# Altium footprint library My_Intlib.PcbLib: 224 footprints (part 8 of 14)
Each footprint in its own frame and in the unit in brackets; x right, y up, seen from the top. Pads: shape width x height; smd on the part's side, far side on the other; paste and mask are expansions set on the pad; w line width, h text height; cw(c..) or ccw(c..) is an arc to the next point about the centre after c.
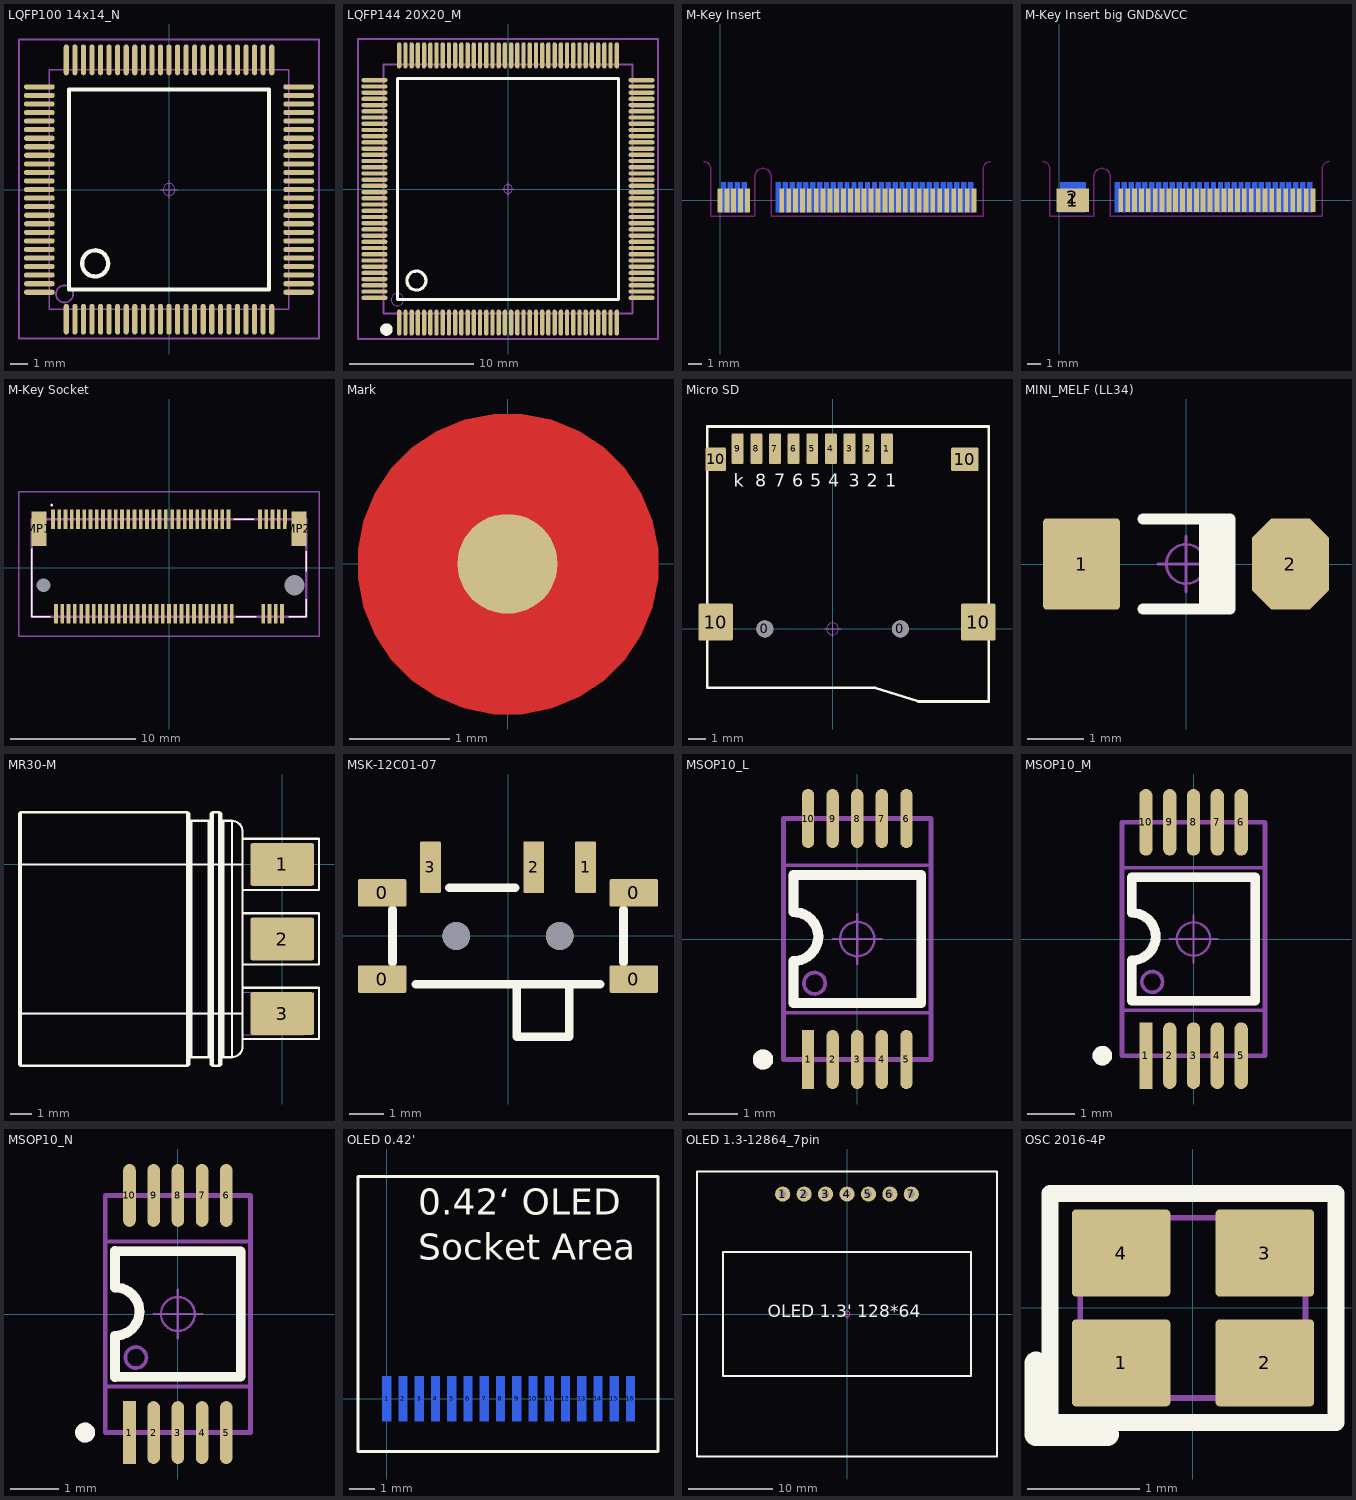
[diagram p7: the footprints below, top view; thin cyan lines are the x and y axes]

## LQFP100 14x14_N [mm] "100脚，体宽14x14mm，脚距0.5mm"
height 1.6
pads (100):
  oval 0.3x1.8 smd: 1(-6,-7.575) 2(-5.5,-7.575) 3(-5,-7.575) 4(-4.5,-7.575) 5(-4,-7.575) 6(-3.5,-7.575) 7(-3,-7.575) 8(-2.5,-7.575) 9(-2,-7.575) 10(-1.5,-7.575) 11(-1,-7.575) 12(-0.5,-7.575) 13(0,-7.575) 14(0.5,-7.575) 15(1,-7.575) 16(1.5,-7.575) 17(2,-7.575) 18(2.5,-7.575) 19(3,-7.575) 20(3.5,-7.575) 21(4,-7.575) 22(4.5,-7.575) 23(5,-7.575) 24(5.5,-7.575) 25(6,-7.575) 51(6,7.575) 52(5.5,7.575) 53(5,7.575) 54(4.5,7.575) 55(4,7.575) 56(3.5,7.575) 57(3,7.575) 58(2.5,7.575) 59(2,7.575) 60(1.5,7.575) 61(1,7.575) 62(0.5,7.575) 63(0,7.575) 64(-0.5,7.575) 65(-1,7.575) 66(-1.5,7.575) 67(-2,7.575) 68(-2.5,7.575) 69(-3,7.575) 70(-3.5,7.575) 71(-4,7.575) 72(-4.5,7.575) 73(-5,7.575) 74(-5.5,7.575) 75(-6,7.575)
  oval 1.8x0.3 smd: 26(7.576,-6) 27(7.576,-5.5) 28(7.576,-5) 29(7.576,-4.5) 30(7.576,-4) 31(7.576,-3.5) 32(7.576,-3) 33(7.576,-2.5) 34(7.576,-2) 35(7.576,-1.5) 36(7.576,-1) 37(7.576,-0.5) 38(7.576,0) 39(7.576,0.5) 40(7.576,1) 41(7.576,1.5) 42(7.576,2) 43(7.576,2.5) 44(7.576,3) 45(7.576,3.5) 46(7.576,4) 47(7.576,4.5) 48(7.576,5) 49(7.576,5.5) 50(7.576,6) 76(-7.575,6) 77(-7.575,5.5) 78(-7.575,5) 79(-7.575,4.5) 80(-7.575,4) 81(-7.575,3.5) 82(-7.575,3) 83(-7.575,2.5) 84(-7.575,2) 85(-7.575,1.5) 86(-7.575,1) 87(-7.575,0.5) 88(-7.575,0) 89(-7.575,-0.5) 90(-7.575,-1) 91(-7.575,-1.5) 92(-7.575,-2) 93(-7.575,-2.5) 94(-7.575,-3) 95(-7.575,-3.5) 96(-7.575,-4) 97(-7.575,-4.5) 98(-7.575,-5) 99(-7.575,-5.5) 100(-7.575,-6)
Top Overlay:
  circle w0.254: c-4.318,-4.318 r0.762
  lines w0.254: -5.842,-5.842 5.842,-5.842 5.842,5.842 -5.842,5.842 -5.842,-5.842
Top Value:
  text ".Comment" at 9.5,1.37 h0.89
Top Assembly:
  text ".Designator" at 9.5,2.164 h0.89
Mechanical 13:
  circle w0.1: c-6.1,-6.1 r0.5
  lines w0.1: -7,-7 -7,7 7,7 7,-7 -7,-7
Mechanical 15:
  circle w0.05: c0,0 r0.35
  lines w0.05: -0.5,0 0.5,0 ; 0,-0.5 0,0.5
  lines w0.1: -8.763,-8.7 -8.763,8.763 8.763,8.763 8.763,-8.7 -8.763,-8.7
3D body "LQFP100-14x14.STEP": height 1.45, standoff -0.01, extent -8.003,-8.003 8.003,8.003

## LQFP144 20X20_M [mm] "144脚，体宽20x20mm，脚距0.5mm"
pads (144):
  oval 0.35x2.1 smd: 1(-8.75,-10.747) 2(-8.25,-10.747) 3(-7.75,-10.747) 4(-7.25,-10.747) 5(-6.75,-10.747) 6(-6.25,-10.747) 7(-5.75,-10.747) 8(-5.25,-10.747) 9(-4.75,-10.747) 10(-4.25,-10.747) 11(-3.75,-10.747) 12(-3.25,-10.747) 13(-2.75,-10.747) 14(-2.25,-10.747) 15(-1.75,-10.747) 16(-1.25,-10.747) 17(-0.75,-10.747) 18(-0.25,-10.747) 19(0.25,-10.747) 20(0.75,-10.747) 21(1.25,-10.747) 22(1.75,-10.747) 23(2.25,-10.747) 24(2.75,-10.747) 25(3.25,-10.747) 26(3.75,-10.747) 27(4.25,-10.747) 28(4.75,-10.747) 29(5.25,-10.747) 30(5.75,-10.747) 31(6.25,-10.747) 32(6.75,-10.747) 33(7.25,-10.747) 34(7.75,-10.747) 35(8.25,-10.747) 36(8.75,-10.747) 73(8.75,10.747) 74(8.25,10.747) 75(7.75,10.747) 76(7.25,10.747) 77(6.75,10.747) 78(6.25,10.747) 79(5.75,10.747) 80(5.25,10.747) 81(4.75,10.747) 82(4.25,10.747) 83(3.75,10.747) 84(3.25,10.747) 85(2.75,10.747) 86(2.25,10.747) 87(1.75,10.747) 88(1.25,10.747) 89(0.75,10.747) 90(0.25,10.747) 91(-0.25,10.747) 92(-0.75,10.747) 93(-1.25,10.747) 94(-1.75,10.747) 95(-2.25,10.747) 96(-2.75,10.747) 97(-3.25,10.747) 98(-3.75,10.747) 99(-4.25,10.747) 100(-4.75,10.747) 101(-5.25,10.747) 102(-5.75,10.747) 103(-6.25,10.747) 104(-6.75,10.747) 105(-7.25,10.747) 106(-7.75,10.747) 107(-8.25,10.747) 108(-8.75,10.747)
  oval 2.1x0.35 smd: 37(10.747,-8.75) 38(10.747,-8.25) 39(10.747,-7.75) 40(10.747,-7.25) 41(10.747,-6.75) 42(10.747,-6.25) 43(10.747,-5.75) 44(10.747,-5.25) 45(10.747,-4.75) 46(10.747,-4.25) 47(10.747,-3.75) 48(10.747,-3.25) 49(10.747,-2.75) 50(10.747,-2.25) 51(10.747,-1.75) 52(10.747,-1.25) 53(10.747,-0.75) 54(10.747,-0.25) 55(10.747,0.25) 56(10.747,0.75) 57(10.747,1.25) 58(10.747,1.75) 59(10.747,2.25) 60(10.747,2.75) 61(10.747,3.25) 62(10.747,3.75) 63(10.747,4.25) 64(10.747,4.75) 65(10.747,5.25) 66(10.747,5.75) 67(10.747,6.25) 68(10.747,6.75) 69(10.747,7.25) 70(10.747,7.75) 71(10.747,8.25) 72(10.747,8.75) 109(-10.747,8.75) 110(-10.747,8.25) 111(-10.747,7.75) 112(-10.747,7.25) 113(-10.747,6.75) 114(-10.747,6.25) 115(-10.747,5.75) 116(-10.747,5.25) 117(-10.747,4.75) 118(-10.747,4.25) 119(-10.747,3.75) 120(-10.747,3.25) 121(-10.747,2.75) 122(-10.747,2.25) 123(-10.747,1.75) 124(-10.747,1.25) 125(-10.747,0.75) 126(-10.747,0.25) 127(-10.747,-0.25) 128(-10.747,-0.75) 129(-10.747,-1.25) 130(-10.747,-1.75) 131(-10.747,-2.25) 132(-10.747,-2.75) 133(-10.747,-3.25) 134(-10.747,-3.75) 135(-10.747,-4.25) 136(-10.747,-4.75) 137(-10.747,-5.25) 138(-10.747,-5.75) 139(-10.747,-6.25) 140(-10.747,-6.75) 141(-10.747,-7.25) 142(-10.747,-7.75) 143(-10.747,-8.25) 144(-10.747,-8.75)
Top Overlay:
  circle w0.508: c-9.779,-11.303 r0.25
  circle w0.254: c-7.366,-7.366 r0.762
  lines w0.254: -8.89,-8.892 8.89,-8.892 8.89,8.89 -8.89,8.89 -8.89,-8.892
Top Value:
  text ".Comment" at 13.945,4.064 h0.89
Top Assembly:
  text ".Designator" at 13.919,4.902 h0.89
Mechanical 13:
  circle w0.1: c-8.894,-8.894 r0.5
  lines w0.15: -10,-10 -10,10 10,10 10,-10 -10,-10
Mechanical 15:
  circle w0.05: c0,0 r0.35
  lines w0.05: -0.5,0 0.5,0 ; 0,-0.5 0,0.5
  lines w0.15: -12.065,-12.065 12.065,-12.065 12.065,12.065 -12.065,12.065 -12.065,-12.065
3D body "LQFP144-20x20.STEP": height 1.45, standoff -0.01, extent -11.003,-11.003 11.003,11.003

## M-Key Insert [mil] "M.2 金手指"
pads (67):
  rect 13.8x68 smd: 1(0,0) 3(20,0) 5(39,0) 7(59,0) 9(79,0) 11(177,0) 13(197,0) 15(216,0) 17(236,0) 19(256,0) 21(276,0) 23(295,0) 25(315,0) 27(334,0) 29(354,0) 31(374,0) 33(394,0) 35(413,0) 37(433,0) 39(453,0) 41(473,0) 43(492,0) 45(512,0) 47(531,0) 49(551,0) 51(571,0) 53(591,0) 55(610,0) 57(630,0) 59(650,0) 61(670,0) 63(689,0) 65(709,0) 67(728,0)
  rect 13.8x86 smd far side: 2(10,9) 4(29,9) 6(49,9) 8(69,9) 10(167,9) 12(187,9) 14(207,9) 16(227,9) 18(246,9) 20(266,9) 22(286,9) 24(305,9) 26(325,9) 28(345,9) 30(364,9) 32(384,9) 34(403,9) 36(423,9) 38(443,9) 40(463,9) 42(482,9) 44(502,9) 46(522,9) 48(541,9) 50(561,9) 52(580,9) 54(600,9) 56(620,9) 58(640,9) 60(659,9) 62(679,9) 64(699,9) 66(719,9)
Keep-Out Layer:
  lines w3.94: -46.39,111.45 cw(c-46.39,91.77) -26.71,91.76 -26.71,-46.03 99.31,-46.03 99.31,66.9 cw(c122.9,68.14) 146.49,66.96 146.49,-46.03 754.79,-46.03 754.79,91.76 cw(c774.47,91.77) 774.47,111.45
Top Value:
  text ".Comment" at 227,83.95 h35
Top Assembly:
  text ".Designator" at 227,115.19 h35

## M-Key Insert big GND&VCC [mil] "M.2 金手指"
pads (60):
  rect 92.99x68 smd: 1(39.42,-0.11)
  rect 72.99x86 smd far side: 2(39.39,9.01)
  rect 13.8x86 smd far side: 10(167,9) 12(187,9) 14(207,9) 16(227,9) 18(246,9) 20(266,9) 22(286,9) 24(305,9) 26(325,9) 28(345,9) 30(364,9) 32(384,9) 34(403,9) 36(423,9) 38(443,9) 40(463,9) 42(482,9) 44(502,9) 46(522,9) 48(541,9) 50(561,9) 52(580,9) 54(600,9) 56(620,9) 58(640,9) 60(659,9) 62(679,9) 64(699,9) 66(719,9)
  rect 13.8x68 smd: 11(177,0) 13(197,0) 15(216,0) 17(236,0) 19(256,0) 21(276,0) 23(295,0) 25(315,0) 27(334,0) 29(354,0) 31(374,0) 33(394,0) 35(413,0) 37(433,0) 39(453,0) 41(473,0) 43(492,0) 45(512,0) 47(531,0) 49(551,0) 51(571,0) 53(591,0) 55(610,0) 57(630,0) 59(650,0) 61(670,0) 63(689,0) 65(709,0) 67(728,0)
Keep-Out Layer:
  lines w3.94: -46.39,111.45 cw(c-46.39,91.77) -26.71,91.76 -26.71,-46.03 99.31,-46.03 99.31,66.9 cw(c122.9,68.14) 146.49,66.96 146.49,-46.03 754.79,-46.03 754.79,91.76 cw(c774.47,91.77) 774.47,111.45
Top Value:
  text ".Comment" at 221,79.95 h35
Top Assembly:
  text ".Designator" at 221,111.19 h35

## M-Key Socket [mm] "M.2 M-Key 3.2h插槽"
pads (71):
  rect 0.3x1.55 smd: 1(9.25,3.888) 2(9,-3.662) 3(8.75,3.888) 4(8.5,-3.662) 5(8.25,3.888) 6(8,-3.662) 7(7.75,3.888) 8(7.5,-3.662) 9(7.25,3.888) 10(5,-3.662) 11(4.75,3.888) 12(4.5,-3.662) 13(4.25,3.888) 14(4,-3.662) 15(3.75,3.888) 16(3.5,-3.662) 17(3.25,3.888) 18(3,-3.662) 19(2.75,3.888) 20(2.5,-3.662) 21(2.25,3.888) 22(2,-3.662) 23(1.75,3.888) 24(1.5,-3.662) 25(1.25,3.888) 26(1,-3.662) 27(0.75,3.888) 28(0.5,-3.662) 29(0.25,3.888) 30(0,-3.662) 31(-0.25,3.888) 32(-0.5,-3.662) 33(-0.75,3.888) 34(-1,-3.662) 35(-1.25,3.888) 36(-1.5,-3.662) 37(-1.75,3.888) 38(-2,-3.662) 39(-2.25,3.888) 40(-2.5,-3.662) 41(-2.75,3.888) 42(-3,-3.662) 43(-3.25,3.888) 44(-3.5,-3.662) 45(-3.75,3.888) 46(-4,-3.662) 47(-4.25,3.888) 48(-4.5,-3.662) 49(-4.75,3.888) 50(-5,-3.662) 51(-5.25,3.888) 52(-5.5,-3.662) 53(-5.75,3.888) 54(-6,-3.662) 55(-6.25,3.888) 56(-6.5,-3.662) 57(-6.75,3.888) 58(-7,-3.662) 59(-7.25,3.888) 60(-7.5,-3.662) 61(-7.75,3.888) 62(-8,-3.662) 63(-8.25,3.888) 64(-8.5,-3.662) 65(-8.75,3.888) 66(-9,-3.662) 67(-9.25,3.888)
  round 0.55 hole 1.1 unplated: MH1(-10,-1.387)
  round 0.8 hole 1.6 unplated: MH2(10,-1.387)
  rect 1.2x2.75 smd: MP1(-10.35,3.112) MP2(10.35,3.112)
Top Overlay:
  lines w0.1: -10.95,1.513 -10.95,-3.888 -9.45,-3.888 ; 5.15,3.862 6.75,3.862 ; 5.35,-3.888 6.95,-3.888 ; 9.55,-3.888 10.95,-3.888 10.95,-2.487 ; 10.95,-0.287 10.95,1.313 ; -9.4,5 ccw(c-9.35,5) -9.3,5 ccw(c-9.35,5) -9.4,5
Top Value:
  text ".Comment" at -6.35,-0.179 h0.89
Top Assembly:
  text ".Designator" at -6.35,0.614 h0.89
Mechanical 13:
  lines w0.2: -10.95,-3.888 10.95,-3.888 10.95,3.862 -10.95,3.862 -10.95,-3.888
Mechanical 15:
  lines w0.1: -11.95,-5.438 11.95,-5.438 11.95,6.05 -11.95,6.05 -11.95,-5.438
3D body "1-2199119-3.stp": height 3.11, standoff -0.52, extent -10.95,-4.21 10.95,4.49

## Mark [mm] "光学定位孔，弥补PCB生产的误差"
pads (1):
  round 1 smd mask+1: ""(0,0)
Top Layer:
  pour cut-out: -1.495,-0.001 -1.495,-0.149 -1.438,-0.439 -1.325,-0.712 -1.16,-0.958 -0.952,-1.167 -0.706,-1.331 -0.433,-1.444 -0.143,-1.501 0.005,-1.501 0.152,-1.501 0.442,-1.444 0.715,-1.331 0.961,-1.167 1.17,-0.958 1.334,-0.712 1.447,-0.439 1.505,-0.149 1.505,-0.001 1.505,0.146 1.447,0.436 1.334,0.709 1.17,0.955 0.961,1.164 0.715,1.328 0.442,1.441 0.152,1.499 0.005,1.499 -0.143,1.499 -0.433,1.441 -0.706,1.328 -0.952,1.164 -1.16,0.955 -1.325,0.709 -1.438,0.436 -1.495,0.146

## Micro SD [mm]
pads (15):
  round 1 hole 1 unplated: 0(-4,0) 0(4,0)
  rrect20% 0.7x1.8 smd: 1(3.2,10.627) 2(2.1,10.627) 3(1,10.627) 4(-0.1,10.627) 5(-1.2,10.627) 6(-2.3,10.627) 7(-3.4,10.627) 8(-4.5,10.627) 9(-5.6,10.627)
  rrect10% 2.032x2.2 smd: 10(-6.9,0.4) 10(8.6,0.4)
  rrect10% 1.2x1.4 smd: 10(-6.9,10)
  rrect10% 1.6x1.4 smd: 10(7.8,10)
Top Overlay:
  lines w0.152: 2.489,-3.47 5.054,-4.283 9.204,-4.283 9.204,11.938 -7.402,11.938 -7.402,-3.47 2.514,-3.47
  text "k" at -5.842,8.382 h0.76
  text "8" at -4.572,8.382 h0.76
  text "7" at -3.455,8.382 h0.76
  text "6" at -2.388,8.382 h0.76
  text "5" at -1.321,8.382 h0.76
  text "4" at -0.254,8.382 h0.76
  text "3" at 0.939,8.382 h0.76
  text "2" at 2.006,8.382 h0.76
  text "1" at 3.098,8.382 h0.76
Top Value:
  text ".Comment" at -2.464,5.053 h0.89
Top Assembly:
  text ".Designator" at -2.464,5.847 h0.89
Mechanical 15:
  circle w0.05: c0,0 r0.35
  lines w0.05: -0.5,0 0.5,0 ; 0,-0.5 0,0.5
3D body "TF 卡座-A.STEP": height 2, standoff -0.45, extent -7.05,-4 8.95,11.25

## MINI_MELF (LL34) [mm] "1.5*3.4mm(直径，脚距）"
pads (2):
  rrect10% 1.37x1.62 smd: 1(-1.855,0)
  oct 1.37x1.62 smd: 2(1.855,0)
Top Overlay:
  rectangle: 0.227,-0.8 0.777,0.8
  lines w0.2: -0.762,-0.8 0.777,-0.8 0.777,0.8 -0.762,0.8
Top Value:
  text ".Comment" at -2.108,-2.846 h0.89
Top Assembly:
  text ".Designator" at -2.108,-2.053 h0.89
Mechanical 15:
  circle w0.05: c0,0 r0.35
  lines w0.05: -0.5,0 0.5,0 ; 0,-0.5 0,0.5
3D body "MINI-MELF.STEP": height 1.5, standoff 0, extent -1.701,-0.75 1.701,0.75

## MR30-M [mm] "MR30公头，航模插头连接器大电流"
pads (3):
  rrect10% 3x2 smd: 1(0,0) 2(0,-3.5) 3(0,-7)
Top Overlay:
  lines w0.1: -12.36,-7 -1.86,-7 ; -12.36,0 -1.86,0 ; -4.36,-9.15 cw(c-4.26,-9.15) -4.26,-9.05 ; -4.36,2.15 ccw(c-4.26,2.15) -4.26,2.05 ; -3.36,-9.15 ccw(c-3.46,-9.15) -3.46,-9.05 ; -3.36,2.15 cw(c-3.46,2.15) -3.46,2.05 ; -2.86,-9.15 cw(c-2.76,-9.15) -2.76,-9.05 ; -2.86,2.15 ccw(c-2.76,2.15) -2.76,2.05 ; -12.26,-9.45 cw(c-12.26,-9.35) -12.36,-9.35 -12.36,2.35 cw(c-12.26,2.35) -12.26,2.45 ; -12.26,-9.45 -12.26,2.45 ; -12.26,-9.45 -4.46,-9.45 ; -12.26,2.45 -4.46,2.45 ; -4.46,-9.45 ccw(c-4.46,-9.35) -4.36,-9.35 -4.36,2.35 ccw(c-4.46,2.35) -4.46,2.45 ; -4.46,-9.45 -4.46,2.45 ; -4.26,-9.05 -3.46,-9.05 ; -4.26,-9.05 -4.26,2.05 ; -4.26,2.05 -3.46,2.05 ; -3.46,-9.05 -3.46,2.05 ; -3.26,-9.45 cw(c-3.26,-9.35) -3.36,-9.35 -3.36,2.35 cw(c-3.26,2.35) -3.26,2.45 ; -3.26,-9.45 -3.26,2.45 ; -3.26,-9.45 -2.96,-9.45 ; -3.26,2.45 -2.96,2.45 ; -2.96,-9.45 ccw(c-2.96,-9.35) -2.86,-9.35 -2.86,2.35 ccw(c-2.96,2.35) -2.96,2.45 ; -2.96,-9.45 -2.96,2.45 ; -2.76,-9.05 -2.36,-9.05 ; -2.76,-9.05 -2.76,2.05 ; -2.76,2.05 -2.36,2.05 ; -2.36,-9.05 ccw(c-2.36,-8.55) -1.86,-8.55 -1.86,1.55 ccw(c-2.36,1.55) -2.36,2.05 ; -2.36,-9.05 -2.36,2.05 ; -1.86,-8.203 1.726,-8.203 1.726,-5.79 -1.86,-5.79 -1.86,-8.203 ; -1.86,-4.703 1.726,-4.703 1.726,-2.29 -1.86,-2.29 -1.86,-4.703 ; -1.86,-1.203 1.726,-1.203 1.726,1.21 -1.86,1.21 -1.86,-1.203
Top Value:
  text ".Comment" at -11.151,-11.457 h0.89
Top Assembly:
  text ".Designator" at -11.151,-10.663 h0.89
Mechanical 15:
  lines w0.013: -12.36,-7 -1.86,-7 ; -12.36,0 -1.86,0 ; -4.36,-9.15 cw(c-4.26,-9.15) -4.26,-9.05 ; -4.36,2.15 ccw(c-4.26,2.15) -4.26,2.05 ; -3.36,-9.15 ccw(c-3.46,-9.15) -3.46,-9.05 ; -3.36,2.15 cw(c-3.46,2.15) -3.46,2.05 ; -2.86,-9.15 cw(c-2.76,-9.15) -2.76,-9.05 ; -2.86,2.15 ccw(c-2.76,2.15) -2.76,2.05 ; -1.86,-8 1.04,-8 1.04,-6 -1.86,-6 ; -12.26,-9.45 cw(c-12.26,-9.35) -12.36,-9.35 -12.36,2.35 cw(c-12.26,2.35) -12.26,2.45 ; -12.26,-9.45 -12.26,2.45 ; -12.26,-9.45 -4.46,-9.45 ; -12.26,2.45 -4.46,2.45 ; -4.46,-9.45 ccw(c-4.46,-9.35) -4.36,-9.35 -4.36,2.35 ccw(c-4.46,2.35) -4.46,2.45 ; -4.46,-9.45 -4.46,2.45 ; -4.26,-9.05 -3.46,-9.05 ; -4.26,-9.05 -4.26,2.05 ; -4.26,2.05 -3.46,2.05 ; -3.46,-9.05 -3.46,2.05 ; -3.26,-9.45 cw(c-3.26,-9.35) -3.36,-9.35 -3.36,2.35 cw(c-3.26,2.35) -3.26,2.45 ; -3.26,-9.45 -3.26,2.45 ; -3.26,-9.45 -2.96,-9.45 ; -3.26,2.45 -2.96,2.45 ; -2.96,-9.45 ccw(c-2.96,-9.35) -2.86,-9.35 -2.86,2.35 ccw(c-2.96,2.35) -2.96,2.45 ; -2.96,-9.45 -2.96,2.45 ; -2.76,-9.05 -2.36,-9.05 ; -2.76,-9.05 -2.76,2.05 ; -2.76,2.05 -2.36,2.05 ; -2.36,-9.05 ccw(c-2.36,-8.55) -1.86,-8.55 -1.86,1.55 ccw(c-2.36,1.55) -2.36,2.05 ; -2.36,-9.05 -2.36,2.05
3D body "MR30-M.STEP": height 2.45, standoff -2.45, extent -12.32,-9.48 1.08,2.42

## MSK-12C01-07 [mm]
pads (9):
  rrect10% 1.4x0.8 smd: 0(-3.65,-1.25) 0(-3.65,1.25) 0(3.65,-1.25) 0(3.65,1.25)
  rrect10% 0.6x1.5 smd: 1(2.25,1.996) 2(0.75,1.996) 3(-2.25,1.996)
  round 0.8 hole 0.8: " "(-1.5,0) " "(1.5,0)
Top Overlay:
  lines w0.254: -3.35,-0.762 -3.35,0.762 ; -2.667,-1.397 2.667,-1.397 ; -1.699,1.397 0.206,1.397 ; 0.254,-1.4 0.254,-2.921 1.778,-2.921 1.778,-1.4 ; 3.35,-0.762 3.35,0.762
Top Value:
  text ".Comment" at -1.905,2.996 h0.89
Top Assembly:
  text ".Designator" at -1.905,3.789 h0.89
3D body "MSK-12C01-07.STEP": height 1.5, standoff -0.5, extent -3.92,-2.887 3.92,2.413

## MSOP10_L [mm] "塑封体长3mm，宽3mm，脚距0.5"
pads (10):
  rect 0.25x1.2 smd: 1(-1,-2.45)
  oval 0.25x1.2 smd: 2(-0.5,-2.45) 3(0,-2.45) 4(0.5,-2.45) 5(1,-2.45) 6(1,2.45) 7(0.5,2.45) 8(0,2.45) 9(-0.5,2.45) 10(-1,2.45)
Top Overlay:
  circle w0.21: c-1.917,-2.45 r0.1
  lines w0.2: -1.3,-1.3 1.3,-1.3 1.3,1.3 -1.3,1.3
  lines w0.203: -1.3,-1.3 -1.3,-0.46 ; -1.3,-0.45 ccw(c-1.3,0.058) -0.792,0.058 ; -1.3,0.55 cw(c-1.3,0.042) -0.792,0.042 ; -1.3,0.556 -1.3,1.3
Top Value:
  text ".Comment" at 2.184,0.38 h0.89
Top Assembly:
  circle w0.21: c-1.917,-2.45 r0.1
  lines w0.2: -1.3,-1.3 1.3,-1.3 1.3,1.3 -1.3,1.3
  lines w0.203: -1.3,-1.3 -1.3,-0.46 ; -1.3,-0.45 ccw(c-1.3,0.058) -0.792,0.058 ; -1.3,0.55 cw(c-1.3,0.042) -0.792,0.042 ; -1.3,0.556 -1.3,1.3
  text ".Designator" at 2.184,1.173 h0.89
Mechanical 13:
  circle w0.076: c-0.867,-0.9 r0.217
  lines w0.076: -1.5,-1.5 -1.5,1.5 1.5,1.5 1.5,-1.5 -1.5,-1.5
Mechanical 15:
  circle w0.05: c0,0 r0.35
  lines w0.05: -0.5,0 0.5,0 ; 0,-0.5 0,0.5
  lines w0.1: -1.5,-2.45 1.5,-2.45 1.5,2.45 -1.5,2.45 -1.5,-2.45
3D body "MSOP-10.STEP": height 0.95, standoff 0, extent -1.5,-2.45 1.5,2.45

## MSOP10_M [mm] "塑封体长3mm，宽3mm，脚距0.5"
pads (10):
  rect 0.28x1.4 smd: 1(-1,-2.45)
  oval 0.28x1.4 smd: 2(-0.5,-2.45) 3(0,-2.45) 4(0.5,-2.45) 5(1,-2.45) 6(1,2.45) 7(0.5,2.45) 8(0,2.45) 9(-0.5,2.45) 10(-1,2.45)
Top Overlay:
  circle w0.21: c-1.917,-2.45 r0.1
  lines w0.2: -1.3,-1.3 1.3,-1.3 1.3,1.3 -1.3,1.3
  lines w0.203: -1.3,-1.3 -1.3,-0.46 ; -1.3,-0.45 ccw(c-1.3,0.058) -0.792,0.058 ; -1.3,0.55 cw(c-1.3,0.042) -0.792,0.042 ; -1.3,0.556 -1.3,1.3
Top Value:
  text ".Comment" at 2.007,0.558 h0.89
Top Assembly:
  circle w0.21: c-1.917,-2.45 r0.1
  lines w0.2: -1.3,-1.3 1.3,-1.3 1.3,1.3 -1.3,1.3
  lines w0.203: -1.3,-1.3 -1.3,-0.46 ; -1.3,-0.45 ccw(c-1.3,0.058) -0.792,0.058 ; -1.3,0.55 cw(c-1.3,0.042) -0.792,0.042 ; -1.3,0.556 -1.3,1.3
  text ".Designator" at 2.007,1.351 h0.89
Mechanical 13:
  circle w0.076: c-0.867,-0.9 r0.217
  lines w0.076: -1.5,-1.5 -1.5,1.5 1.5,1.5 1.5,-1.5 -1.5,-1.5
Mechanical 15:
  circle w0.05: c0,0 r0.35
  lines w0.05: -0.5,0 0.5,0 ; 0,-0.5 0,0.5
  lines w0.1: -1.5,-2.45 1.5,-2.45 1.5,2.45 -1.5,2.45 -1.5,-2.45
3D body "MSOP-10.STEP": height 0.95, standoff 0, extent -1.5,-2.45 1.5,2.45

## MSOP10_N [mm] "塑封体长3mm，宽3mm，脚距0.5"
pads (10):
  rect 0.26x1.3 smd: 1(-1,-2.45)
  oval 0.26x1.3 smd: 2(-0.5,-2.45) 3(0,-2.45) 4(0.5,-2.45) 5(1,-2.45) 6(1,2.45) 7(0.5,2.45) 8(0,2.45) 9(-0.5,2.45) 10(-1,2.45)
Top Overlay:
  circle w0.21: c-1.917,-2.45 r0.1
  lines w0.2: -1.3,-1.3 1.3,-1.3 1.3,1.3 -1.3,1.3
  lines w0.203: -1.3,-1.3 -1.3,-0.46 ; -1.3,-0.45 ccw(c-1.3,0.058) -0.792,0.058 ; -1.3,0.55 cw(c-1.3,0.042) -0.792,0.042 ; -1.3,0.556 -1.3,1.3
Top Value:
  text ".Comment" at 2.032,0.507 h0.89
Top Assembly:
  circle w0.21: c-1.917,-2.45 r0.1
  lines w0.2: -1.3,-1.3 1.3,-1.3 1.3,1.3 -1.3,1.3
  lines w0.203: -1.3,-1.3 -1.3,-0.46 ; -1.3,-0.45 ccw(c-1.3,0.058) -0.792,0.058 ; -1.3,0.55 cw(c-1.3,0.042) -0.792,0.042 ; -1.3,0.556 -1.3,1.3
  text ".Designator" at 2.032,1.3 h0.89
Mechanical 13:
  circle w0.076: c-0.867,-0.9 r0.217
  lines w0.076: -1.5,-1.5 1.5,-1.5 1.5,1.5 -1.5,1.5 -1.5,-1.5
Mechanical 15:
  circle w0.05: c0,0 r0.35
  lines w0.05: -0.5,0 0.5,0 ; 0,-0.5 0,0.5
  lines w0.1: -1.5,-2.45 -1.5,2.45 1.5,2.45 1.5,-2.45 -1.5,-2.45
3D body "MSOP-10.STEP": height 0.95, standoff 0, extent -1.5,-2.45 1.5,2.45

## OLED 0.42' [mm]
pads (16):
  rect 0.35x1.8 smd far side mask+0.1: 1(0.004,0) 2(0.654,0) 3(1.304,0) 4(1.954,0) 5(2.604,0) 6(3.254,0) 7(3.904,0) 8(4.554,0) 9(5.204,0) 10(5.854,0) 11(6.504,0) 12(7.154,0) 13(7.804,0) 14(8.454,0) 15(9.104,0) 16(9.754,0)
Top Overlay:
  lines w0.102: -1.143,-2.11 -1.143,8.89 10.857,8.89 10.857,-2.11 -1.143,-2.11
  text "0.42‘ OLED  / Socket Area" at 1.27,5.207 h1.8
Top Value:
  text ".Comment" at 1.016,2.158 h0.89
Top Assembly:
  text ".Designator" at 1.016,2.951 h0.89
3D body "0.42_OLED.STEP": height 1, standoff -0.5, extent -1.143,-5.565 10.857,8.89

## OLED 1.3-12864_7pin [mm] "长：35.4mm，宽：33.5mm，"
pads (7):
  round 1.8 hole 0.8: 1(-7.62,14.21) 2(-5.08,14.21) 3(-2.54,14.21) 4(0,14.21) 5(2.54,14.21) 6(5.08,14.21) 7(7.62,14.21)
Top Overlay:
  lines w0.2: -17.78,-16.891 17.78,-16.891 17.78,16.891 -17.78,16.891 -17.78,-16.891 ; -14.7,-7.35 -14.7,7.35 14.7,7.35 14.7,-7.35 -14.7,-7.35
  text "OLED 1.3' 128*64" at -9.398,-0.889 h2.54
Top Value:
  text ".Comment" at -8.89,9.778 h0.89
Top Assembly:
  text ".Designator" at -8.89,10.571 h0.89
Mechanical 15:
  circle w0.05: c0,0 r0.35
  lines w0.05: -0.5,0 0.5,0 ; 0,-0.5 0,0.5
3D body "OLED 1.3-12864_7pin.STEP": height 14.14, standoff 2.62, extent -17.7,-16.75 17.7,16.75
3D body "HDR2.54-1P_M.STEP": height 8.5, standoff -3, extent -3.81,12.954 -1.27,15.494
3D body "HDR2.54-1P_M.STEP": height 8.5, standoff -3, extent -8.89,12.954 -6.35,15.494
3D body "HDR2.54-1P_M.STEP": height 8.5, standoff -3, extent -6.35,12.954 -3.81,15.494
3D body "HDR2.54-1P_M.STEP": height 8.5, standoff -3, extent 3.81,12.954 6.35,15.494
3D body "HDR2.54-1P_M.STEP": height 8.5, standoff -3, extent -1.27,12.954 1.27,15.494
3D body "HDR2.54-1P_M.STEP": height 8.5, standoff -3, extent 1.27,12.954 3.81,15.494
3D body "HDR2.54-1P_M.STEP": height 8.5, standoff -3, extent 6.35,12.954 8.89,15.494

## OSC 2016-4P [mm] "3.2*2.5*0.7mm(长宽高)"
pads (4):
  rrect10% 0.875x0.775 smd: 1(-0.638,-0.488) 2(0.638,-0.488) 3(0.638,0.488) 4(-0.638,0.488)
Top Overlay:
  lines w0.152: -1.27,-1.016 1.27,-1.016 1.27,1.016 -1.27,1.016 -1.27,-1.016
  lines w0.203: -1.394,-0.488 -1.394,-1.123 -0.759,-1.123
Top Value:
  text ".Comment" at 1.502,-0.743 h0.89
Top Assembly:
  text ".Designator" at 1.502,0.05 h0.89
Mechanical 15:
  region: -1,0.8 -0.325,0.8 -0.325,0.225 -1,0.225
  region: 0.325,0.8 1,0.8 1,0.225 0.325,0.225
  region: 0.325,-0.225 1,-0.225 1,-0.8 0.325,-0.8
  region: -1,-0.225 -0.325,-0.225 -0.325,-0.8 -1,-0.8
  region: -0.94,-0.8 -0.941,-0.776 -0.976,-0.741 -1.024,-0.741 -1.059,-0.776 -1.06,-0.8 -1.059,-0.825 -1.024,-0.859 -0.976,-0.859 -0.941,-0.825
  lines w0.051: -1,-0.8 1,-0.8 1,0.8 -1,0.8 -1,-0.8
3D body "OSC 2016-4P.STEP": height 0.51, standoff 0, extent -0.981,-0.78 1.019,0.82